# Altium schematic symbol library Connectors.SchLib: 83 symbols
Pins are listed as number, name and electrical type; pins without a type are passive.

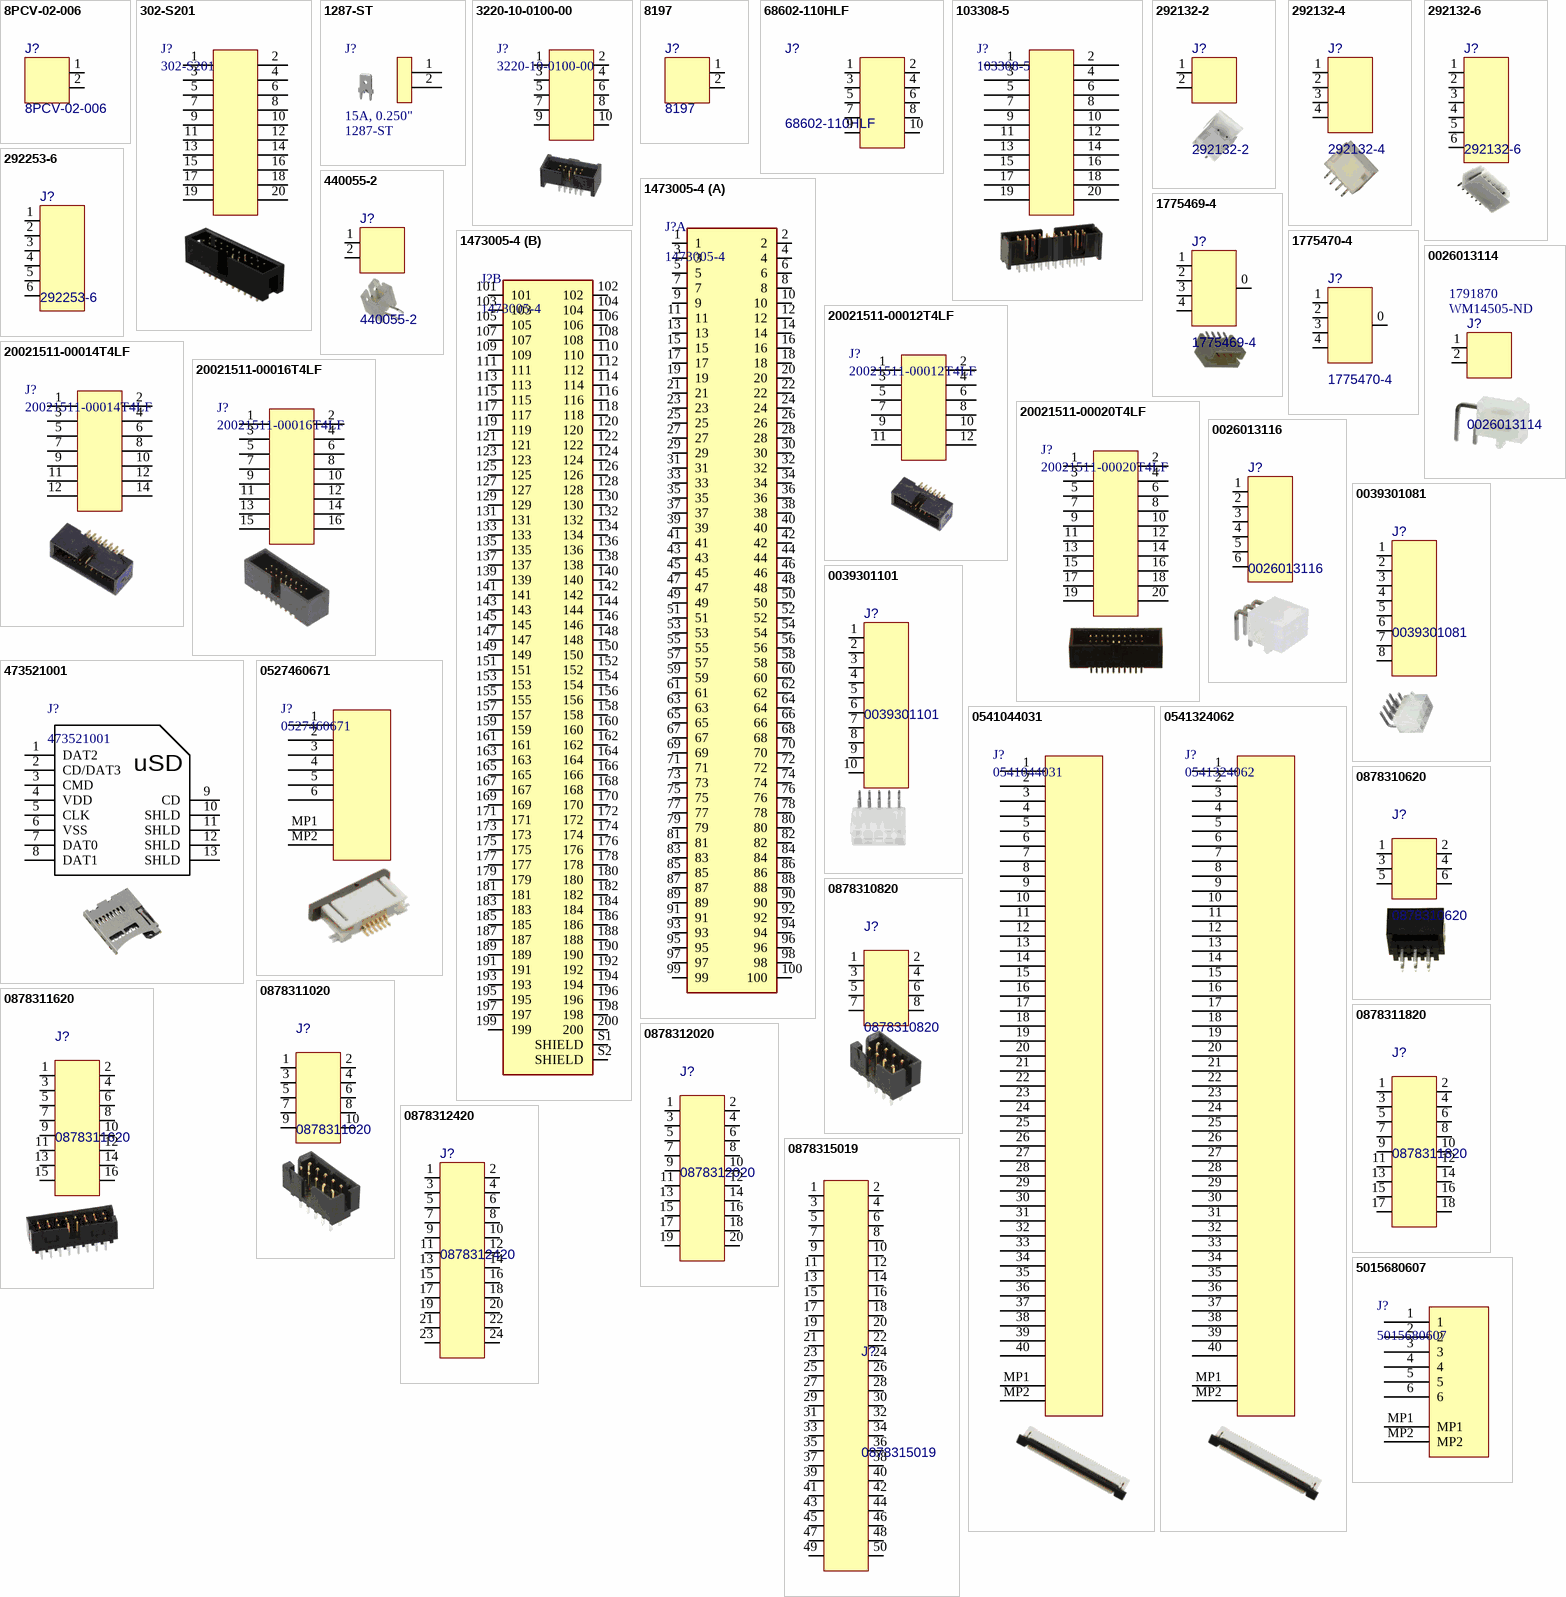
[diagram p0: symbols 8PCV-02-006 to 5015680607]

## 8PCV-02-006
designator J?
CONN BARRIER STRIP 2CIRC 0.438"; Manufacturer: Tyco; Pitch - Mating: 0.438" (11.12mm); Number of Positions: 2; Number of Positions Loaded: All; Style: Barrier Block; Shrouding: Unshrouded; Material Flammability Rating: UL94 V-0; Current Rating: 30A; Voltage Rating: 600V; Manufacturer Part Number: 8PCV-02-006; Category: Connectors, Interconnects; Stock 1: 32617; Pricing 1: 1=0.15, 10=0.136, 100=0.0841, 500=0.0696, 1000=0.0609, 5000=0.0522, 10000=0.05075 (USD); Number of Rows: 1; Mounting Type: Through Hole; Operating Temperature: -40°C ~ 105°C; Insulation Color: Black; ComponentLink1URL: https://cdn.harwin.com/pdfs/M20-999.pdf; ComponentLink1Description: https://cdn.harwin.com/pdfs/M20-999.pdf; Supplier 1: Digi-Key; Supplier Part Number 1: A98460-ND
footprint 8PCV-02-006
pins: 1 ?, 2 ?

## 302-S201
designator J?
CONN HEADER VERT 20POS 2.54MM; Manufacturer: On Shore; Number of Contacts: 20; Current Rating: 3A; Shrouded: Yes (With); Manufacturer Part Number: 302-S201; Connector Type: Header; Min Operating Temperature: -40°C; Max Operating Temperature: 105°C; Number of Rows: 2; Orientation: Straight; Number of Positions: 20; Height: 9.1mm; Pitch: 2.54mm; Row Spacing: 2.54mm; ComponentLink1URL: https://datasheet.ciiva.com/714/eng-cd-103308-m-714897.pdf?src-supplier=Digi-Key; ComponentLink1Description: https://datasheet.ciiva.com/714/eng-cd-103308-m-714897.pdf?src-supplier=Digi-Key; Supplier 1: Digi-Key; Supplier Part Number 1: ED10524-ND
footprint 302-S201
pins: 1, 2, 3, 4, 5, 6, 7, 8, 9, 10, 11, 12, 13, 14, 15, 16, 17, 18, 19, 20

## 1287-ST
designator J?, comment 15A, 0.250"  Manufacturer Part Number: 1287-ST
CONN TERM .052"DIA .250" TH; Manufacturer: Keystone Electronics; Number of Positions: 1; Supplier 1: Mouser; Stock 1: 119349; Pricing 1: 1=0.19, 10=0.184, 50=0.156, 100=0.114, 1000=0.083, 10000=0.07 (USD); Case/Package: 052; Orientation: Straight; Diameter: 1inch; ComponentLink1URL: https://datasheet.ciiva.com/16740/m60-2p53-16740650.pdf; ComponentLink1Description: https://datasheet.ciiva.com/16740/m60-2p53-16740650.pdf; Supplier Part Number 1: 534-1287-ST
footprint Keystone-1287-st (Footprint not found)
pins: 1, 2

## 3220-10-0100-00
designator J?
CONN HEADER VERT 10POS 1.27MM; Manufacturer: CNC Tech; Number of Contacts: 10; Manufacturer Part Number: 3220-10-0100-00; Category: Headers and Wire Housings; Min Operating Temperature: -40°C; Max Operating Temperature: 105°C; Number of Rows: 2; Orientation: Straight; Pitch: 1.27mm; ComponentLink1URL: https://datasheet.ciiva.com/22665/shf-22665879.pdf?src-supplier=Element14; ComponentLink1Description: https://datasheet.ciiva.com/22665/shf-22665879.pdf?src-supplier=Element14; Supplier 1: Digi-Key; Supplier Part Number 1: 1175-1627-ND
footprint FP-SHF-105-01-L-D-TH-MFG
pins: 1, 2, 3, 4, 5, 6, 7, 8, 9, 10

## 8197
designator J?
TERM SCREW 6-32 6 PIN PCB; Manufacturer: Keystone; Style: Screw Terminal; Current: 30A; Manufacturer Part Number: 8197; Screw Size: 6-32; Mounting Type: Through Hole; ComponentLink1URL: https://cdn.harwin.com/pdfs/M20-999.pdf; ComponentLink1Description: https://cdn.harwin.com/pdfs/M20-999.pdf; Supplier 1: Digi-Key; Supplier Part Number 1: 36-8197-ND
footprint Keystone 8197
pins: 1 ?, 2 ?

## 68602-110HLF
designator J?
CONN HEADER VERT 10POS 2.54MM; Manufacturer: Amphenol FCI; Number of Positions: 10; Pitch: 0.100" (2.54mm); Manufacturer Part Number: 68602-110HLF; Category: Connectors; Number of Rows: 2; ComponentLink1URL: https://media.digikey.com/pdf/Data%20Sheets/Sullins%20PDFs/Female_Headers.100_DS.pdf?src-supplier=Digi-Key; ComponentLink1Description: https://media.digikey.com/pdf/Data%20Sheets/Sullins%20PDFs/Female_Headers.100_DS.pdf?src-supplier=Digi-Key; Supplier 1: Digi-Key; Supplier Part Number 1: 609-3458-ND; Supplier 2: Mouser; Supplier Part Number 2: 649-68602-110HLF
footprint 68602-110HLF
pins: 1, 2, 3, 4, 5, 6, 7, 8, 9, 10

## 103308-5
designator J?
CONN RCPT 10x2 VERT 0.1" TH; Manufacturer: TE Connectivity; Number of Contacts: 20; Current Rating: 1A; PCB Mount Retention: Without; PCB Mounting Orientation: Vertical; PCB Mount Alignment: Yes (With); Pitch: 2.54mm; Supplier 1: Digi-Key; Manufacturer Part Number: 103308-5; Category: Headers and Wire Housings; Stock 1: 105; Pricing 1: 1=2.16000, 10=1.96000, 100=1.67970, 500=1.39978, 1000=1.19981, 5000=1.06383 (USD); Min Operating Temperature: -65°C; Max Operating Temperature: 105°C; Number of Rows: 2; Orientation: Straight; Number of Positions: 20; Shrouded: Yes (With); Height: 9.77mm; Row Spacing: 2.54mm; Shrouded End Dimension: 3.81mm; ComponentLink1URL: https://datasheet.ciiva.com/714/eng-cd-103308-m-714897.pdf?src-supplier=Digi-Key; ComponentLink1Description: https://datasheet.ciiva.com/714/eng-cd-103308-m-714897.pdf?src-supplier=Digi-Key; Supplier Part Number 1: A26273-ND
footprint TE_103308-5
pins: 1, 2, 3, 4, 5, 6, 7, 8, 9, 10, 11, 12, 13, 14, 15, 16, 17, 18, 19, 20

## 292132-2
designator J?
CONN HEADER VERT 2POS 2MM; Manufacturer: Tyco; Current Rating: 2A; Voltage Rating: 125VAC; Number of Positions: 2; Working Voltage: 100V; Manufacturer Part Number: 292132-2; Colour: White,Natural; Number of Rows: 1; Orientation: Vertical; Pitch: 2mm; ComponentLink1URL: https://datasheet.ciiva.com/11747/0900766b8082653c-11747869.pdf; ComponentLink1Description: https://datasheet.ciiva.com/11747/0900766b8082653c-11747869.pdf; Supplier 1: Digi-Key; Supplier Part Number 1: A98777-ND; Supplier 2: Mouser; Supplier Part Number 2: 571-292132-2
footprint TE 292132-2
pins: 1 ?, 2 ?

## 292132-4
designator J?
CONN HEADER VERT 4POS 2MM; Manufacturer: Tyco; Current Rating: 2A; Voltage Rating: 125VAC; Number of Positions: 4; Working Voltage: 100V; Manufacturer Part Number: 292132-4; Colour: White,Natural; Number of Rows: 1; Orientation: Vertical; Pitch: 2mm; ComponentLink1URL: https://datasheet.ciiva.com/11747/0900766b8082653c-11747869.pdf; ComponentLink1Description: https://datasheet.ciiva.com/11747/0900766b8082653c-11747869.pdf; Supplier 1: Digi-Key; Supplier Part Number 1: A98779-ND; Supplier 2: Mouser; Supplier Part Number 2: 571-292132-4
footprint TE 292132-4
pins: 1 ?, 2 ?, 3 ?, 4 ?

## 292132-6
designator J?
CONN HEADER VERT 6POS 2MM; Manufacturer: Tyco; Current Rating: 2A; Number of Poles: 6; Voltage Rating (AC): 100V; Manufacturer Part Number: 292132-6; Colour: White,Natural; Housing Colour: Natural; Min Operating Temperature: -25°C; Max Operating Temperature: 85°C; Number of Rows: 1; Voltage Rating: 100V; Number of Positions: 6; Fastening Type: Detent; Number of Contacts: 6; Working Voltage: 100V; Orientation: Right Angle; Height: 9.4mm; Pitch: 2mm; Lead Pitch: 2mm; ComponentLink1URL: https://datasheet.ciiva.com/11747/0900766b8082653c-11747869.pdf; ComponentLink1Description: https://datasheet.ciiva.com/11747/0900766b8082653c-11747869.pdf; Supplier 1: Digi-Key; Supplier Part Number 1: A98781-ND; Supplier 2: Newark; Supplier Part Number 2: 70AH7398
footprint TE 292132-6
pins: 1 ?, 2 ?, 3 ?, 4 ?, 5 ?, 6 ?

## 292253-6
designator J?
CONN HEADER R/A 6POS 2MM; Manufacturer: Tyco; Current Rating: 2A; Number of Poles: 6; Voltage Rating (AC): 100V; Manufacturer Part Number: 292253-6; Colour: White,Natural; Housing Colour: Natural; Min Operating Temperature: -25°C; Max Operating Temperature: 85°C; Number of Rows: 1; Voltage Rating: 100V; Number of Positions: 6; Fastening Type: Detent; Number of Contacts: 6; Working Voltage: 100V; Orientation: Right Angle; Height: 9.4mm; Pitch: 2mm; Lead Pitch: 2mm; Supplier 1: Digi-Key; Supplier Part Number 1: A98578-ND
footprint TE 292253-6
pins: 1 ?, 2 ?, 3 ?, 4 ?, 5 ?, 6 ?

## 440055-2
designator J?
CONN HEADER R/A 2POS 2MM; Manufacturer: Tyco; Current Rating: 2A; Voltage Rating: 125VAC; Number of Positions: 2; Working Voltage: 100V; Manufacturer Part Number: 440055-2; Colour: White,Natural; Number of Rows: 1; Orientation: Vertical; Pitch: 2mm; ComponentLink1URL: https://datasheet.ciiva.com/11747/0900766b8082653c-11747869.pdf; ComponentLink1Description: https://datasheet.ciiva.com/11747/0900766b8082653c-11747869.pdf; Supplier 1: Digi-Key; Supplier Part Number 1: A100043-ND; Supplier 2: Mouser; Supplier Part Number 2: 571-440055-2
footprint TE 440055-2
pins: 1 ?, 2 ?

## 1473005-4
designator J?
CONN SODIMM-200 1.8V RA 0.6mm SMD; Manufacturer: TE Connectivity; Manufacturer Part Number: 14730054; Number of Contacts: 200; PCB Mount Retention: With; Row Spacing: 0.244inch; Supplier 1: Digi-Key; Category: Memory Connectors; Min Operating Temperature: -67°C; Max Operating Temperature: 185°C; Number of Rows: 2; Orientation: Right Angle; Number of Positions: 200; Voltage Rating: 1.8V; Pitch: 0.6mm; ComponentLink1URL: https://datasheet.ciiva.com/682/eng-cd-1473005-j2-682720.pdf?src-supplier=Farnell; ComponentLink1Description: https://datasheet.ciiva.com/682/eng-cd-1473005-j2-682720.pdf?src-supplier=Farnell; Supplier Part Number 1: A114851-ND
footprint TE_1473005-4
part A pins: 1, 2, 3, 4, 5, 6, 7, 8, 9, 10, 11, 12, 13, 14, 15, 16, 17, 18, 19, 20, 21, 22, 23, 24, 25, 26, 27, 28, 29, 30, 31, 32, 33, 34, 35, 36, 37, 38, 39, 40, 41, 42, 43, 44, 45, 46, 47, 48, 49, 50, 51, 52, 53, 54, 55, 56, 57, 58, 59, 60, 61, 62, 63, 64, 65, 66, 67, 68, 69, 70, 71, 72, 73, 74, 75, 76, 77, 78, 79, 80, 81, 82, 83, 84, 85, 86, 87, 88, 89, 90, 91, 92, 93, 94, 95, 96, 97, 98, 99, 100
part B pins: 101, 102, 103, 104, 105, 106, 107, 108, 109, 110, 111, 112, 113, 114, 115, 116, 117, 118, 119, 120, 121, 122, 123, 124, 125, 126, 127, 128, 129, 130, 131, 132, 133, 134, 135, 136, 137, 138, 139, 140, 141, 142, 143, 144, 145, 146, 147, 148, 149, 150, 151, 152, 153, 154, 155, 156, 157, 158, 159, 160, 161, 162, 163, 164, 165, 166, 167, 168, 169, 170, 171, 172, 173, 174, 175, 176, 177, 178, 179, 180, 181, 182, 183, 184, 185, 186, 187, 188, 189, 190, 191, 192, 193, 194, 195, 196, 197, 198, 199, 200, S1 SHIELD, S2 SHIELD

## 1775469-4
designator J?
CONN HEADER SMD R/A 4POS 2MM; Manufacturer: Molex; Current Rating: 3A; Number of Poles: 4; Voltage Rating: 250V; Manufacturer Part Number: 1775469-4; Colour: White,Natural; Housing Colour: Natural; Min Operating Temperature: -25°C; Max Operating Temperature: 85°C; Number of Rows: 1; Number of Positions: 4; Orientation: Right Angle; Height: 5.51mm; Pitch: 2mm; ComponentLink1URL: https://datasheet.ciiva.com/11747/0900766b8082653c-11747869.pdf; ComponentLink1Description: https://datasheet.ciiva.com/11747/0900766b8082653c-11747869.pdf; Supplier 1: Digi-Key; Supplier Part Number 1: A100082CT-ND
footprint Molex 1775469-4
pins: 0 ?, 1 ?, 2 ?, 3 ?, 4 ?

## 1775470-4
designator J?
CONN HEADER SMD 4POS 2MM; Manufacturer: Molex; Current Rating: 3A; Number of Poles: 4; Voltage Rating: 250V; Manufacturer Part Number: 1775470-4; Colour: White,Natural; Housing Colour: Natural; Min Operating Temperature: -25°C; Max Operating Temperature: 85°C; Number of Rows: 1; Number of Positions: 4; Orientation: Right Angle; Height: 6.14mm; Pitch: 2mm; ComponentLink1URL: https://datasheet.ciiva.com/11747/0900766b8082653c-11747869.pdf; ComponentLink1Description: https://datasheet.ciiva.com/11747/0900766b8082653c-11747869.pdf; Supplier 1: Digi-Key; Supplier Part Number 1: A100054CT-ND
footprint Molex 1775470-4
pins: 0 ?, 1 ?, 2 ?, 3 ?, 4 ?

## 20021511-00012T4LF
designator J?
CONN HEADER VERT 12POS 1.27MM; Manufacturer: Amphenol FCI; Number of Contacts: 12; Manufacturer Part Number: 20021511-00012T4LF; Min Operating Temperature: -55°C; Max Operating Temperature: 125°C; Number of Rows: 2; Orientation: Straight; Pitch: 1.27mm; ComponentLink1URL: https://datasheet.ciiva.com/22665/shf-22665879.pdf?src-supplier=Element14; ComponentLink1Description: https://datasheet.ciiva.com/22665/shf-22665879.pdf?src-supplier=Element14; Supplier 1: Digi-Key; Supplier Part Number 1: 609-20021511-00012T4LF-ND
footprint 20021511-00012T4LF
pins: 1, 2, 3, 4, 5, 6, 7, 8, 9, 10, 11, 12

## 20021511-00014T4LF
designator J?
CONN HEADER VERT 14POS 1.27MM; Manufacturer: Amphenol FCI; Number of Contacts: 14; Manufacturer Part Number: 20021511-00014T4LF; Min Operating Temperature: -55°C; Max Operating Temperature: 125°C; Number of Rows: 2; Orientation: Straight; Pitch: 1.27mm; ComponentLink1URL: https://datasheet.ciiva.com/22665/shf-22665879.pdf?src-supplier=Element14; ComponentLink1Description: https://datasheet.ciiva.com/22665/shf-22665879.pdf?src-supplier=Element14; Supplier 1: Digi-Key; Supplier Part Number 1: 609-20021511-00014T4LF-ND
footprint 20021511-00012T4LF
pins: 1, 2, 3, 4, 5, 6, 7, 8, 9, 10, 11, 12, 12, 14

## 20021511-00016T4LF
designator J?
CONN HEADER VERT 16POS 1.27MM; Manufacturer: Amphenol FCI; Number of Contacts: 16; Manufacturer Part Number: 20021511-00016T4LF; Min Operating Temperature: -55°C; Max Operating Temperature: 125°C; Number of Rows: 2; Orientation: Straight; Pitch: 1.27mm; ComponentLink1URL: https://datasheet.ciiva.com/22665/shf-22665879.pdf?src-supplier=Element14; ComponentLink1Description: https://datasheet.ciiva.com/22665/shf-22665879.pdf?src-supplier=Element14; Supplier 1: Digi-Key; Supplier Part Number 1: 609-5421-ND
footprint 20021511-00016T4LF
pins: 1, 2, 3, 4, 5, 6, 7, 8, 9, 10, 11, 12, 13, 14, 15, 16

## 20021511-00020T4LF
designator J?
CONN HEADER VERT 20POS 1.27MM; Manufacturer: Amphenol; Number of Positions: 20; Current Rating: 1A; Shrouded: Yes (With); Pitch: 0.050" (1.27mm); Manufacturer Part Number: 20021511-00020T4LF; Connector Type: Header; Min Operating Temperature: -40°C; Max Operating Temperature: 105°C; Number of Rows: 2; Orientation: Straight; Height: 0.213" (5.40mm); Row Spacing: 0.050" (1.27mm); ComponentLink1URL: https://datasheet.ciiva.com/714/eng-cd-103308-m-714897.pdf?src-supplier=Digi-Key; ComponentLink1Description: https://datasheet.ciiva.com/714/eng-cd-103308-m-714897.pdf?src-supplier=Digi-Key; Supplier 1: Digi-Key; Supplier Part Number 1: 609-20021511-00020T4LF-ND
footprint 20021511-00020T4LF
pins: 1, 2, 3, 4, 5, 6, 7, 8, 9, 10, 11, 12, 13, 14, 15, 16, 17, 18, 19, 20

## 0026013114
designator J?  Supplier Part Number 1: WM14505-ND  Supplier Part Number 2: 1791870
CONN HEADER R/A 2POS; Manufacturer: Molex; Current Rating: 6A; Voltage Rating: 600V; Number of Positions: 2; Pitch: 0.165" (4.20mm); Manufacturer Part Number: 0026013114; Colour: White; Min Operating Temperature: -25°C; Max Operating Temperature: 85°C; Number of Rows: 2; Fastening Type: Locking Ramp; Number of Contacts: 2; Orientation: Right Angle; ComponentLink1URL: https://datasheet.ciiva.com/11747/0900766b8082653c-11747869.pdf; ComponentLink1Description: https://datasheet.ciiva.com/11747/0900766b8082653c-11747869.pdf; Features: Board Lock; Supplier 1: Digi-Key; Supplier 2: RSComponents
footprint Molex Mini Fit Jr 2 Right Angle
pins: 1 ?, 2 ?

## 0026013116
designator J?
CONN HEADER R/A 6POS 4.2MM; Manufacturer: Molex; Current Rating: 6A; Voltage Rating: 600V; Number of Positions: 6; Pitch: 0.165" (4.20mm); Manufacturer Part Number: 0026013116; Colour: White; Min Operating Temperature: -25°C; Max Operating Temperature: 85°C; Number of Rows: 2; Fastening Type: Locking Ramp; Number of Contacts: 6; Orientation: Right Angle; ComponentLink1URL: https://datasheet.ciiva.com/11747/0900766b8082653c-11747869.pdf; ComponentLink1Description: https://datasheet.ciiva.com/11747/0900766b8082653c-11747869.pdf; Features: Board Lock; Supplier 1: Digi-Key; Supplier Part Number 1: WM16234-ND
footprint Molex Mini Fit Jr 6 Right Angle (Molex Mini Fit Jr 6 Right angle)
pins: 1 ?, 2 ?, 3 ?, 4 ?, 5 ?, 6 ?

## 0039301081
designator J?
CONN HEADER R/A 8POS 4.2MM; Manufacturer: Molex; Current Rating: 6A; Voltage Rating: 600V; Number of Positions: 8; Pitch: 0.165" (4.20mm); Manufacturer Part Number: 0039301081; Colour: White; Min Operating Temperature: -25°C; Max Operating Temperature: 85°C; Number of Rows: 2; Fastening Type: Locking Ramp; Number of Contacts: 8; Orientation: Right Angle; ComponentLink1URL: https://datasheet.ciiva.com/11747/0900766b8082653c-11747869.pdf; ComponentLink1Description: https://datasheet.ciiva.com/11747/0900766b8082653c-11747869.pdf; Features: Board Lock; Supplier 1: Digi-Key; Supplier Part Number 1: WM1366-ND
footprint Molex Mini Fit Jr 8 Right Angle
pins: 1 ?, 2 ?, 3 ?, 4 ?, 5 ?, 6 ?, 7 ?, 8 ?

## 0039301101
designator J?
CONN HEADER R/A 10POS 4.2MM; Manufacturer: Molex; Current Rating: 6A; Voltage Rating: 600V; Number of Positions: 10; Pitch: 0.165" (4.20mm); Manufacturer Part Number: 0039301101; Colour: White; Min Operating Temperature: -25°C; Max Operating Temperature: 85°C; Number of Rows: 2; Fastening Type: Locking Ramp; Number of Contacts: 10; Orientation: Right Angle; ComponentLink1URL: https://datasheet.ciiva.com/11747/0900766b8082653c-11747869.pdf; ComponentLink1Description: https://datasheet.ciiva.com/11747/0900766b8082653c-11747869.pdf; Features: Board Lock; Supplier 1: Digi-Key; Supplier Part Number 1: WM1367-ND
footprint Molex Mini Fit Jr 10 Right Angle
pins: 1 ?, 2 ?, 3 ?, 4 ?, 5 ?, 6 ?, 7 ?, 8 ?, 9 ?, 10 ?

## 473521001
designator J?
CONN RCPT micro SD card RA SMD; Manufacturer: Molex; Manufacturer Part Number: 47352-1001; Number of Contacts: 8; Max Voltage Rating (DC): 100V; Pitch: 1.1mm; Supplier 1: Digi-Key; Category: Memory Connectors; Stock 1: 11363; Pricing 1: 1=3.94000, 10=3.78500, 25=3.47000, 50=3.31240, 100=3.15460, 250=2.76024 (USD); Min Operating Temperature: -20°C; Max Operating Temperature: 85°C; Orientation: Right Angle; Number of Rows: 1; ComponentLink1URL: https://datasheet.ciiva.com/16547/0473521001-memory-card-socket-16547169.pdf?src-supplier=Avnet+Europe; ComponentLink1Description: https://datasheet.ciiva.com/16547/0473521001-memory-card-socket-16547169.pdf?src-supplier=Avnet+Europe; Supplier Part Number 1: WM3290CT-ND
footprint MOLX-473521001_V (SMD, 8-Leads, Body 15.2x14mm, Pitch 1.1mm)
pins: 1 DAT2, 2 CD/DAT3, 3 CMD, 4 VDD, 5 CLK, 6 VSS, 7 DAT0, 8 DAT1, 9 CD, 10 SHLD, 11 SHLD, 12 SHLD, 13 SHLD
text: uSD

## 0527460671
designator J?
CONN FFC BOTTOM 6POS 0.50MM R/A; Manufacturer: Molex; Number of Positions: 6; Pitch: 0.5mm; Manufacturer Part Number: 0527460671; Category: Headers and Wire Housings; Number of Rows: 1; ComponentLink1URL: https://www.hirose.com/product/en/download_file/key_name/FX22/category/Catalog/doc_file_id/49374/?file_category_id=4&item_id=205&is_series=1&src-supplier=Digi-Key; ComponentLink1Description: https://www.hirose.com/product/en/download_file/key_name/FX22/category/Catalog/doc_file_id/49374/?file_category_id=4&item_id=205&is_series=1&src-supplier=Digi-Key; Supplier 1: Digi-Key; Supplier Part Number 1: WM7977CT-ND; Contacts: Bottom
footprint 527460671
pins: 1, 2, 3, 4, 5, 6, MP1, MP2

## 0541044031
designator J?
CONN FFC TOP 40POS 0.50MM R/A; Manufacturer: Molex; Number of Positions: 40; Pitch: 0.5mm; Manufacturer Part Number: 0541044031; Category: Headers and Wire Housings; Number of Rows: 1; Contacts: Top; Supplier 1: Digi-Key; Supplier Part Number 1: WM3431CT-ND
footprint 0541044031
pins: 1, 2, 3, 4, 5, 6, 7, 8, 9, 10, 11, 12, 13, 14, 15, 16, 17, 18, 19, 20, 21, 22, 23, 24, 25, 26, 27, 28, 29, 30, 31, 32, 33, 34, 35, 36, 37, 38, 39, 40, MP1, MP2

## 0541324062
designator J?
CONN FFC BOTTOM 40POS 0.50MM R/A; Manufacturer: Molex; Number of Positions: 40; Pitch: 0.5mm; Manufacturer Part Number: 0541324062; Category: Headers and Wire Housings; Number of Rows: 1; Contacts: Bottom; Supplier 1: Digi-Key; Supplier Part Number 1: WM3436CT-ND; Supplier 2: Newark; Supplier Part Number 2: 55R0591; Supplier 3: Mouser; Supplier Part Number 3: 538-54132-4062
footprint 0541324062
pins: 1, 2, 3, 4, 5, 6, 7, 8, 9, 10, 11, 12, 13, 14, 15, 16, 17, 18, 19, 20, 21, 22, 23, 24, 25, 26, 27, 28, 29, 30, 31, 32, 33, 34, 35, 36, 37, 38, 39, 40, MP1, MP2

## 0878310620
designator J?
CONN HEADER VERT 6POS 2MM; Manufacturer: Molex; Current Rating: 2A; Voltage Rating: 125V; Number of Contacts: 6; Manufacturer Part Number: 0878310620; Colour: Black; Number of Rows: 2; Fastening Type: Keyed; Orientation: Straight; Pitch: 2mm; Series: Milli-Grid 87831; Supplier 1: Digi-Key; Supplier Part Number 1: WM18558-ND
footprint MOLEX 0878310620
pins: 1 ?, 2 ?, 3 ?, 4 ?, 5 ?, 6 ?

## 0878310820
designator J?
CONN HEADER VERT 8POS 2MM; Manufacturer: Molex; Current Rating: 2A; Voltage Rating: 125V; Number of Contacts: 8; Manufacturer Part Number: 0878310820; Colour: Black; Number of Rows: 2; Fastening Type: Keyed; Orientation: Straight; Pitch: 2mm; Series: Milli-Grid 87831; Supplier 1: Digi-Key; Supplier Part Number 1: WM18559-ND
footprint MOLEX 0878310820
pins: 1 ?, 2 ?, 3 ?, 4 ?, 5 ?, 6 ?, 7 ?, 8 ?

## 0878311020
designator J?
CONN HEADER VERT 10POS 2MM; Manufacturer: Molex; Current Rating: 2A; Voltage Rating: 125V; Number of Contacts: 10; Manufacturer Part Number: 0878311020; Colour: Black; Number of Rows: 2; Fastening Type: Keyed; Orientation: Straight; Pitch: 2mm; Series: Milli-Grid 87831; Supplier 1: Digi-Key; Supplier Part Number 1: WM18560-ND
footprint MOLEX 0878311020
pins: 1 ?, 2 ?, 3 ?, 4 ?, 5 ?, 6 ?, 7 ?, 8 ?, 9 ?, 10 ?

## 0878311620
designator J?
CONN HEADER VERT 16POS 2MM; Manufacturer: Molex; Current Rating: 2A; Voltage Rating: 125V; Number of Contacts: 16; Manufacturer Part Number: 0878311620; Colour: Black; Number of Rows: 2; Fastening Type: Keyed; Orientation: Straight; Pitch: 2mm; Series: Milli-Grid 87831; Supplier 1: Digi-Key; Supplier Part Number 1: WM18562-ND
footprint MOLEX 0878311620
pins: 1 ?, 2 ?, 3 ?, 4 ?, 5 ?, 6 ?, 7 ?, 8 ?, 9 ?, 10 ?, 11 ?, 12 ?, 13 ?, 14 ?, 15 ?, 16 ?

## 0878311820
designator J?
CONN HEADER VERT 18POS 2MM; Manufacturer: Molex; Current Rating: 2A; Voltage Rating: 125V; Number of Contacts: 18; Manufacturer Part Number: 0878311820; Colour: Black; Number of Rows: 2; Fastening Type: Keyed; Orientation: Straight; Pitch: 2mm; Series: Milli-Grid 87831; Supplier 1: Digi-Key; Supplier Part Number 1: WM18563-ND
footprint MOLEX 0878311820
pins: 1 ?, 2 ?, 3 ?, 4 ?, 5 ?, 6 ?, 7 ?, 8 ?, 9 ?, 10 ?, 11 ?, 12 ?, 13 ?, 14 ?, 15 ?, 16 ?, 17 ?, 18 ?

## 0878312020
designator J?
CONN HEADER VERT 20POS 2MM; Manufacturer: Molex; Current Rating: 2A; Voltage Rating: 125V; Number of Contacts: 20; Manufacturer Part Number: 0878312020; Colour: Black; Number of Rows: 2; Fastening Type: Keyed; Orientation: Straight; Pitch: 2mm; Series: Milli-Grid 87831; Supplier 1: Digi-Key; Supplier Part Number 1: WM18564-ND
footprint MOLEX 0878312020
pins: 1 ?, 2 ?, 3 ?, 4 ?, 5 ?, 6 ?, 7 ?, 8 ?, 9 ?, 10 ?, 11 ?, 12 ?, 13 ?, 14 ?, 15 ?, 16 ?, 17 ?, 18 ?, 19 ?, 20 ?

## 0878312420
designator J?
CONN HEADER VERT 24POS 2MM; Manufacturer: Molex; Current Rating: 2A; Voltage Rating: 125V; Number of Contacts: 24; Manufacturer Part Number: 0878312420; Colour: Black; Number of Rows: 2; Fastening Type: Keyed; Orientation: Straight; Pitch: 2mm; Series: Milli-Grid 87831; Supplier 1: Digi-Key; Supplier Part Number 1: WM17470-ND
footprint MOLEX 0878312420
pins: 1 ?, 2 ?, 3 ?, 4 ?, 5 ?, 6 ?, 7 ?, 8 ?, 9 ?, 10 ?, 11 ?, 12 ?, 13 ?, 14 ?, 15 ?, 16 ?, 17 ?, 18 ?, 19 ?, 20 ?, 21 ?, 22 ?, 23 ?, 24 ?

## 0878315019
designator J?
CONN HEADER VERT 50POS 2MM; Manufacturer: Molex; Current Rating: 2A; Voltage Rating: 125V; Number of Contacts: 50; Manufacturer Part Number: 0878315019; Colour: Black; Number of Rows: 2; Fastening Type: Keyed; Orientation: Straight; Pitch: 2mm; Series: Milli-Grid 87831; Supplier 1: Mouser; Supplier Part Number 1: 538-87831-5019
footprint MOLEX 0878315019 (MOLEX  0878315019)
pins: 1 ?, 2 ?, 3 ?, 4 ?, 5 ?, 6 ?, 7 ?, 8 ?, 9 ?, 10 ?, 11 ?, 12 ?, 13 ?, 14 ?, 15 ?, 16 ?, 17 ?, 18 ?, 19 ?, 20 ?, 21 ?, 22 ?, 23 ?, 24 ?, 25 ?, 26 ?, 27 ?, 28 ?, 29 ?, 30 ?, 31 ?, 32 ?, 33 ?, 34 ?, 35 ?, 36 ?, 37 ?, 38 ?, 39 ?, 40 ?, 41 ?, 42 ?, 43 ?, 44 ?, 45 ?, 46 ?, 47 ?, 48 ?, 49 ?, 50 ?

## 5015680607
designator J?
CONN HEADER SMD R/A 6POS 1MM; Manufacturer: Molex; Number of Positions: 6; Current Rating: 1A; Voltage Rating: 125V; Pitch: 0.039inch; Supplier 1: Digi-Key; Manufacturer Part Number: 5015680607; Orientation: Surface Mount, Right Angle; Number of Rows: 1; Number of Contacts: 6; ComponentLink1URL: https://datasheet.ciiva.com/25617/0900766b81113a8e-25617748.pdf?src-supplier=RSComponents; ComponentLink1Description: https://datasheet.ciiva.com/25617/0900766b81113a8e-25617748.pdf?src-supplier=RSComponents; Supplier Part Number 1: 732-2002-1-ND
footprint Pico-Clasp 6pos
pins: 1, 2, 3, 4, 5, 6, MP1, MP2

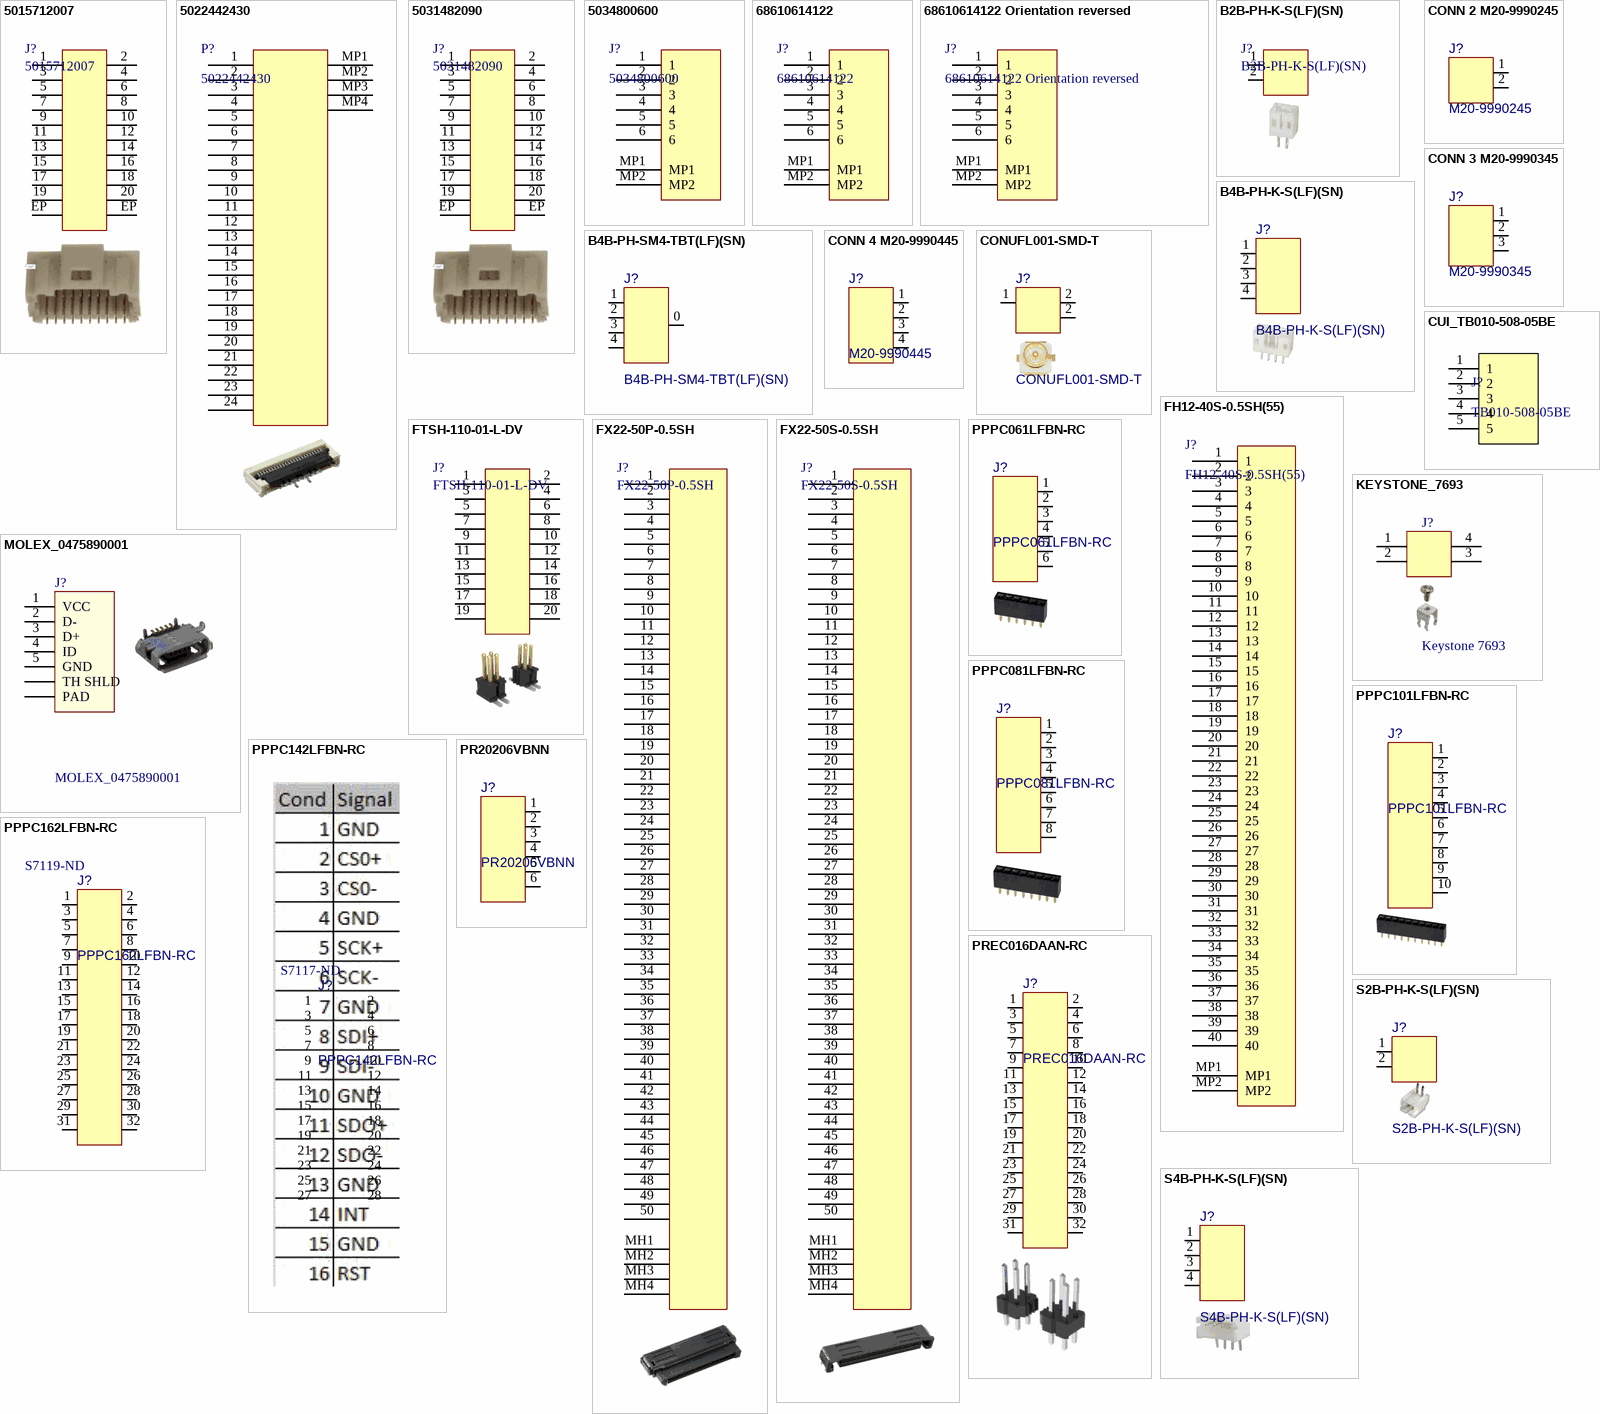
[diagram p1: symbols 5015712007 to S4B-PH-K-S(LF)(SN)]

## 5015712007
designator J?
CONN HEADER SMD R/A 20POS 1MM; Manufacturer: Molex; Number of Contacts: 20; Manufacturer Part Number: 5015712007; Min Operating Temperature: -55°C; Max Operating Temperature: 125°C; Number of Rows: 2; Mounting Type: Surface Mount, Right Angle; Pitch: 1mm; ComponentLink1URL: https://datasheet.ciiva.com/22665/shf-22665879.pdf?src-supplier=Element14; ComponentLink1Description: https://datasheet.ciiva.com/22665/shf-22665879.pdf?src-supplier=Element14; Supplier 1: Digi-Key; Supplier Part Number 1: WM7911CT-ND
pins: 1, 2, 3, 4, 5, 6, 7, 8, 9, 10, 11, 12, 13, 14, 15, 16, 17, 18, 19, 20, EP, EP

## 5022442430
designator P?